# Altium footprint library Austindetz_CM4_Board_v1.0.PcbLib: 102 footprints (part 7 of 7)
Each footprint in its own frame and in the unit in brackets; x right, y up, seen from the top. Pads: shape width x height; smd on the part's side, far side on the other; paste and mask are expansions set on the pad; w line width, h text height; cw(c..) or ccw(c..) is an arc to the next point about the centre after c.
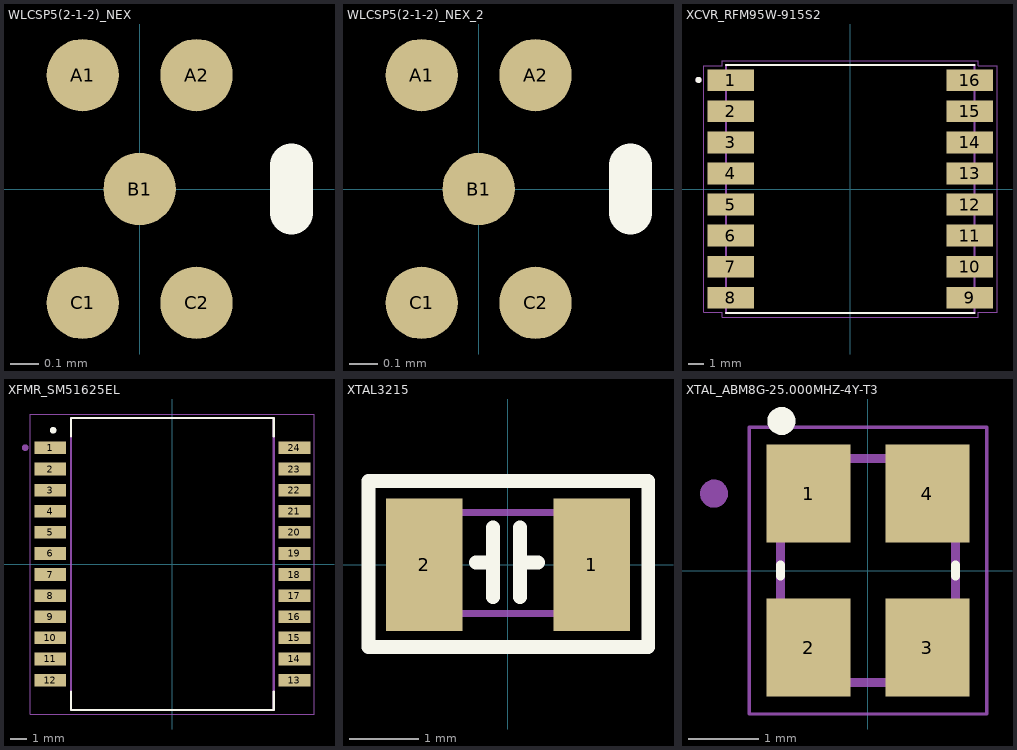
[diagram p6: the footprints below, top view; thin cyan lines are the x and y axes]

## WLCSP5(2-1-2)_NEX [mil]
height 35.04
pads (5):
  round 10 smd paste+0 mask+0: A1(-7.87,15.75) A2(7.87,15.75) B1(0,0) C1(-7.87,-15.75) C2(7.87,-15.75)
Top Overlay:
  lines w6: 21,-3.29 21,3.29
3D body "PCMF1USB3SZ.STEP": height 17.04, standoff -8.16, extent -15.31,-23.03 15,23.03

## WLCSP5(2-1-2)_NEX_2 [mil]
pads (5):
  round 10 smd paste+0 mask+0: A1(-7.87,15.75) A2(7.87,15.75) B1(0,0) C1(-7.87,-15.75) C2(7.87,-15.75)
Top Overlay:
  lines w6: 21,-3.29 21,3.29
3D body "PCMF1USB3SZ.STEP": height 17.04, standoff -8.16, extent -15.31,-23.03 15,23.03

## XCVR_RFM95W-915S2 [mm]
height 0.89
pads (16):
  rect 3x1.4 smd: 1(-7.7,7) 2(-7.7,5) 3(-7.7,3) 4(-7.7,1) 5(-7.7,-1) 6(-7.7,-3) 7(-7.7,-5) 8(-7.7,-7) 9(7.7,-7) 10(7.7,-5) 11(7.7,-3) 12(7.7,-1) 13(7.7,1) 14(7.7,3) 15(7.7,5) 16(7.7,7)
Top Overlay:
  circle w0.2: c-9.773,7.029 r0.1
  lines w0.127: -8,-8 8,-8 ; -8,8 8,8
Mechanical 13:
  circle w0.2: c-9.773,7.029 r0.1
  lines w0.127: -8,-8 8,-8 8,8 -8,8 -8,-8
Mechanical 15:
  lines w0.05: -9.45,-7.95 -9.45,7.95 -8.25,7.95 -8.25,8.25 8.25,8.25 8.25,7.95 9.45,7.95 9.45,-7.95 8.25,-7.95 8.25,-8.25 -8.25,-8.25 -8.25,-7.95 -9.45,-7.95
3D body "RFM95W-915S2.step": height 1.8, standoff 0, extent -7.873,-8 8.127,8

## XFMR_SM51625EL [mm]
height 1.15
pads (24):
  rect 1.9x0.76 smd: 1(-7.35,6.985) 2(-7.35,5.715) 3(-7.35,4.445) 4(-7.35,3.175) 5(-7.35,1.905) 6(-7.35,0.635) 7(-7.35,-0.635) 8(-7.35,-1.905) 9(-7.35,-3.175) 10(-7.35,-4.445) 11(-7.35,-5.715) 12(-7.35,-6.985) 13(7.35,-6.985) 14(7.35,-5.715) 15(7.35,-4.445) 16(7.35,-3.175) 17(7.35,-1.905) 18(7.35,-0.635) 19(7.35,0.635) 20(7.35,1.905) 21(7.35,3.175) 22(7.35,4.445) 23(7.35,5.715) 24(7.35,6.985)
Top Overlay:
  circle w0.2: c-7.169,8.047 r0.1
  lines w0.127: -6.1,-7.685 -6.1,-8.775 6.1,-8.775 6.1,-7.685 ; -6.1,7.685 -6.1,8.775 6.1,8.775 6.1,7.685
Mechanical 13:
  circle w0.2: c-8.85,7 r0.1
  lines w0.127: -6.1,-8.775 -6.1,8.775 6.1,8.775 6.1,-8.775 -6.1,-8.775
Mechanical 15:
  lines w0.05: -8.55,-9.025 -8.55,9.025 8.55,9.025 8.55,-9.025 -8.55,-9.025
3D body "step_temp.STEP": height 6.25, standoff 0, extent -8,-8.775 8,8.775

## XTAL3215 [mm] "XTAL3215"
pads (2):
  rect 1.1x1.9 smd: 1(1.2,0) 2(-1.2,0)
Top Overlay:
  lines w0.2: -0.462,0.031 -0.212,0.034 ; -0.212,-0.466 -0.212,0.534 ; 0.172,-0.465 0.172,0.535 ; 0.172,0.035 0.427,0.031 ; -2,-1.18 -0.25,-1.18 2.01,-1.18 2.01,0.61 2.01,1.2 -1.84,1.2 -2,1.2 -2,1.03 -2,-1.18
Top Assembly:
  lines w0.1: -1.6,-0.7 1.7,-0.7 1.7,0.75 -0.313,0.75 -1.6,0.75 -1.6,-0.7
  text "'.Designator'" at -0.626,-0.385 h1.27
3D body "User Library-NDK_NX3215SA.STEP": height 0.8, standoff 0, extent -1.61,-0.74 1.59,0.76

## XTAL_ABM8G-25.000MHZ-4Y-T3 [mm]
height 1
pads (4):
  rect 1.2x1.4 smd: 1(-0.85,1.1) 2(-0.85,-1.1) 3(0.85,-1.1) 4(0.85,1.1)
Top Overlay:
  circle w0.2: c-1.237,2.139 r0.1
  lines w0.127: -1.25,-0.08 -1.25,0.08 ; 1.25,-0.08 1.25,0.08
Mechanical 13:
  circle w0.2: c-2.2,1.1 r0.1
  lines w0.127: -1.25,-1.6 1.25,-1.6 1.25,1.6 -1.25,1.6 -1.25,-1.6
Mechanical 15:
  lines w0.05: -1.7,-2.05 1.7,-2.05 1.7,2.05 -1.7,2.05 -1.7,-2.05
3D body "step_temp.STEP": height 0.99, standoff 0, extent -1.6,-1.245 1.6,1.245